# Altium footprint library LUMI_Handy_Soldering_LIB.PcbLib: 562 footprints (part 30 of 36)
Each footprint in its own frame and in the unit in brackets; x right, y up, seen from the top. Pads: shape width x height; smd on the part's side, far side on the other; paste and mask are expansions set on the pad; w line width, h text height; cw(c..) or ccw(c..) is an arc to the next point about the centre after c.
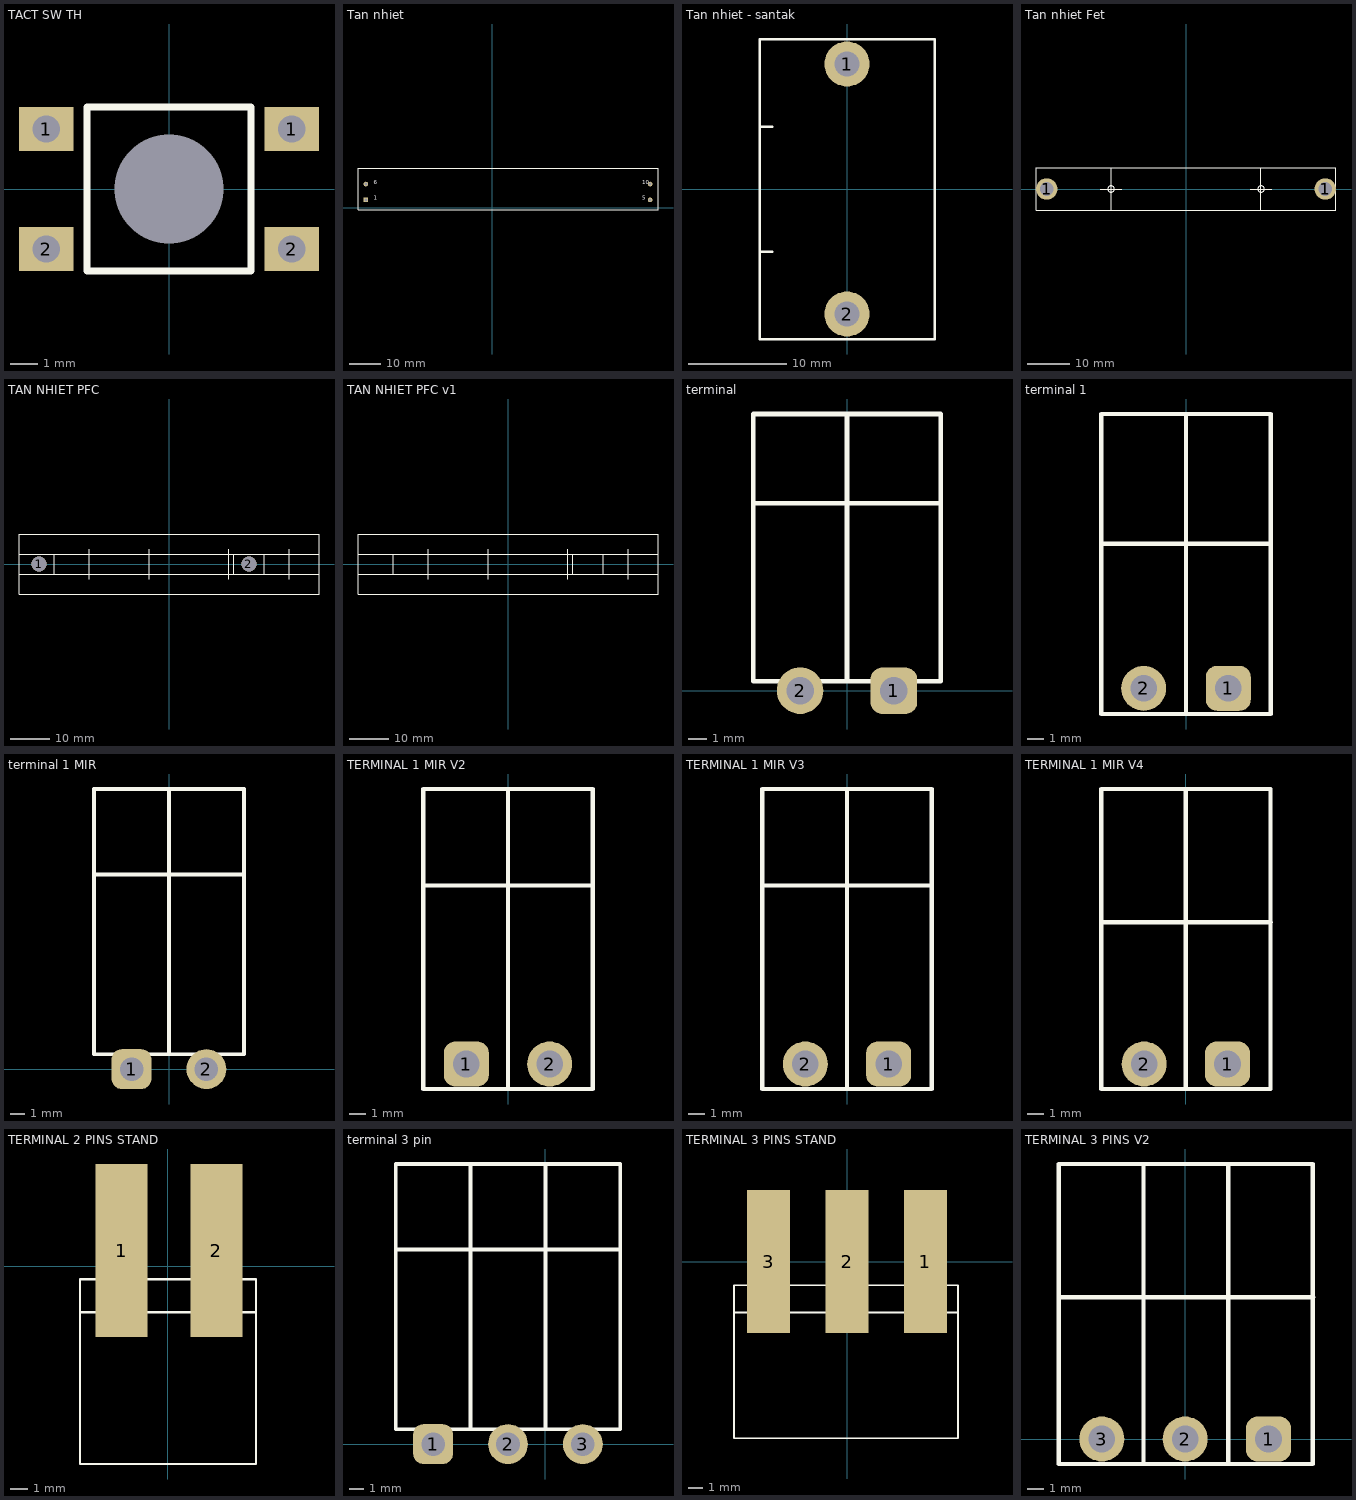
[diagram p29: the footprints below, top view; thin cyan lines are the x and y axes]

## TACT SW TH [mm]
pads (5):
  rect 2x1.6 hole 1: 1(-4.5,2.2) 1(4.5,2.2) 2(-4.5,-2.2) 2(4.5,-2.2)
  round 0 hole 4: ""(0,0)
Top Overlay:
  lines w0.254: -3,-3 3,-3 3,3 -3,3 -3,-3

## Tan nhiet [mm] "Connector; Header; 5x2 Position"
pads (4):
  rect 1.5x1.5 hole 0.9: 1(-40.64,2.54)
  round 1.5 hole 0.9: 5(50.8,2.54) 6(-40.64,7.62) 10(50.8,7.62)
Top Overlay:
  lines w0.2: -43.18,-0.635 53.34,-0.635 53.34,12.7 -43.18,12.7 -43.18,-0.635
  text "1" at -38.1,2.54 h1.27
  text "5" at 48.26,2.54 h1.27
  text "10" at 48.26,7.62 h1.27
  text "6" at -38.1,7.62 h1.27
3D body: height 103.52, standoff 0.52, extent -44.92,-0.979 55.08,33.02

## Tan nhiet - santak [mil]
pads (2):
  round 180 hole 100: 1(0,500) 2(0,-500)
Top Overlay:
  lines w10: -350,-250 -300,-250 ; -350,250 -300,250 ; -350,-600 350,-600 350,600 -350,600 -350,-600
Mechanical 1:
  circle w5: c0,500 r45
3D body: height 300, standoff -200, extent -50,-549.9 49.61,-450.1
3D body: height 300, standoff -200, extent -50,450.1 49.61,549.9
3D body: height 1400, standoff 10, extent -350,-600 350,602

## Tan nhiet Fet [mil]
pads (2):
  round 200 hole 130: 1(-1300,0) 1(1300,0)
Top Overlay:
  circle w10: c700,0 r30
  circle w10: c-700,0 r30
  lines w10: -800,0 -600,0 ; -700,-200 -700,200 ; 600,0 800,0 ; 700,-200 700,200 ; -1400,-200 -1400,200 1400,200 1400,-200 -1400,-200
3D body: height 300, standoff -200, extent 1200,-99.8 1399.21,99.8
3D body: height 899.8, standoff 700.2, extent 600.79,-200 800,200
3D body: height 899.8, standoff 700.2, extent -800,-200 -600.79,200
3D body: height 300, standoff -200, extent -1400,-99.8 -1200.79,99.8
3D body: height 899.8, standoff 700.2, extent -800,-200 -600.79,200
3D body: height 2300, standoff 5, extent -1400,-200 1400,200

## TAN NHIET PFC [mm]
pads (2):
  round 3.81 hole 3.81: 1(-33.02,0) 2(20.32,0)
Top Overlay:
  lines w0.127: -29.21,-2.54 -29.21,2.54 ; 16.51,-2.54 16.51,2.54 ; 24.13,-2.54 24.13,2.54
  lines w0.254: -38.1,-2.54 38.1,-2.54 ; -38.1,2.54 38.1,2.54 ; -20.32,-3.81 -20.32,3.81 ; -5.08,-3.81 -5.08,3.81 ; 15.24,-3.81 15.24,3.81 ; 30.48,-3.81 30.48,3.81 ; -38.1,-7.62 38.1,-7.62 38.1,7.62 -38.1,7.62 -38.1,-7.62
3D body: height 5.08, standoff 0, extent -38.1,-2.54 -29.21,2.54
3D body: height 5.08, standoff 0, extent 16.51,-2.54 24.13,2.54
3D body: height 33.02, standoff 5.08, extent -38.1,-2.54 38.1,2.54
3D body: height 38.1, standoff 33.02, extent -38.1,-7.62 -22.86,7.62
3D body: height 38.1, standoff 33.02, extent -17.78,-7.62 -2.54,7.62
3D body: height 38.1, standoff 33.02, extent 2.54,-7.62 17.78,7.62
3D body: height 38.1, standoff 33.02, extent 22.86,-7.62 38.1,7.62
3D body: height 53.34, standoff 38.1, extent -38.1,6.35 -22.86,7.62
3D body: height 53.34, standoff 38.1, extent -38.1,4.064 -22.86,5.334
3D body: height 53.34, standoff 38.1, extent -38.1,1.651 -22.86,2.921
3D body: height 53.34, standoff 38.1, extent -38.1,-0.635 -22.86,0.635
3D body: height 53.34, standoff 38.1, extent -38.1,-2.921 -22.86,-1.651
3D body: height 53.34, standoff 38.1, extent -38.1,-5.461 -22.86,-4.191
3D body: height 53.34, standoff 38.1, extent -38.1,-7.62 -22.86,-6.35
3D body: height 53.34, standoff 38.1, extent -17.78,6.35 -2.54,7.62
3D body: height 53.34, standoff 38.1, extent -17.78,4.064 -2.54,5.334
3D body: height 53.34, standoff 38.1, extent -17.78,1.651 -2.54,2.921
3D body: height 53.34, standoff 38.1, extent -17.78,-0.635 -2.54,0.635
3D body: height 53.34, standoff 38.1, extent -17.78,-2.921 -2.54,-1.651
3D body: height 53.34, standoff 38.1, extent -17.78,-5.461 -2.54,-4.191
3D body: height 53.34, standoff 38.1, extent -17.78,-7.62 -2.54,-6.35
3D body: height 53.34, standoff 38.1, extent 2.54,6.35 17.78,7.62
3D body: height 53.34, standoff 38.1, extent 2.54,4.064 17.78,5.334
3D body: height 53.34, standoff 38.1, extent 2.54,1.651 17.78,2.921
3D body: height 53.34, standoff 38.1, extent 2.54,-0.635 17.78,0.635
3D body: height 53.34, standoff 38.1, extent 2.54,-2.921 17.78,-1.651
3D body: height 53.34, standoff 38.1, extent 2.54,-5.461 17.78,-4.191
3D body: height 53.34, standoff 38.1, extent 2.54,-7.62 17.78,-6.35
3D body: height 53.34, standoff 38.1, extent 22.86,6.35 38.1,7.62
3D body: height 53.34, standoff 38.1, extent 22.86,4.064 38.1,5.334
3D body: height 53.34, standoff 38.1, extent 22.86,1.651 38.1,2.921
3D body: height 53.34, standoff 38.1, extent 22.86,-0.635 38.1,0.635
3D body: height 53.34, standoff 38.1, extent 22.86,-2.921 38.1,-1.651
3D body: height 53.34, standoff 38.1, extent 22.86,-5.461 38.1,-4.191
3D body: height 53.34, standoff 38.1, extent 22.86,-7.62 38.1,-6.35

## TAN NHIET PFC v1 [mm]
Top Overlay:
  lines w0.127: -29.21,-2.54 -29.21,2.54 ; 16.51,-2.54 16.51,2.54 ; 24.13,-2.54 24.13,2.54
  lines w0.254: -38.1,-2.54 38.1,-2.54 ; -38.1,2.54 38.1,2.54 ; -20.32,-3.81 -20.32,3.81 ; -5.08,-3.81 -5.08,3.81 ; 15.24,-3.81 15.24,3.81 ; 30.48,-3.81 30.48,3.81 ; -38.1,-7.62 38.1,-7.62 38.1,7.62 -38.1,7.62 -38.1,-7.62
3D body: height 5.08, standoff 0, extent -38.1,-2.54 -29.21,2.54
3D body: height 5.08, standoff 0, extent 16.51,-2.54 24.13,2.54
3D body: height 33.02, standoff 5.08, extent -38.1,-2.54 38.1,2.54
3D body: height 38.1, standoff 33.02, extent -38.1,-7.62 -22.86,7.62
3D body: height 38.1, standoff 33.02, extent -17.78,-7.62 -2.54,7.62
3D body: height 38.1, standoff 33.02, extent 2.54,-7.62 17.78,7.62
3D body: height 38.1, standoff 33.02, extent 22.86,-7.62 38.1,7.62
3D body: height 53.34, standoff 38.1, extent -38.1,6.35 -22.86,7.62
3D body: height 53.34, standoff 38.1, extent -38.1,4.064 -22.86,5.334
3D body: height 53.34, standoff 38.1, extent -38.1,1.651 -22.86,2.921
3D body: height 53.34, standoff 38.1, extent -38.1,-0.635 -22.86,0.635
3D body: height 53.34, standoff 38.1, extent -38.1,-2.921 -22.86,-1.651
3D body: height 53.34, standoff 38.1, extent -38.1,-5.461 -22.86,-4.191
3D body: height 53.34, standoff 38.1, extent -38.1,-7.62 -22.86,-6.35
3D body: height 53.34, standoff 38.1, extent -17.78,6.35 -2.54,7.62
3D body: height 53.34, standoff 38.1, extent -17.78,4.064 -2.54,5.334
3D body: height 53.34, standoff 38.1, extent -17.78,1.651 -2.54,2.921
3D body: height 53.34, standoff 38.1, extent -17.78,-0.635 -2.54,0.635
3D body: height 53.34, standoff 38.1, extent -17.78,-2.921 -2.54,-1.651
3D body: height 53.34, standoff 38.1, extent -17.78,-5.461 -2.54,-4.191
3D body: height 53.34, standoff 38.1, extent -17.78,-7.62 -2.54,-6.35
3D body: height 53.34, standoff 38.1, extent 2.54,6.35 17.78,7.62
3D body: height 53.34, standoff 38.1, extent 2.54,4.064 17.78,5.334
3D body: height 53.34, standoff 38.1, extent 2.54,1.651 17.78,2.921
3D body: height 53.34, standoff 38.1, extent 2.54,-0.635 17.78,0.635
3D body: height 53.34, standoff 38.1, extent 2.54,-2.921 17.78,-1.651
3D body: height 53.34, standoff 38.1, extent 2.54,-5.461 17.78,-4.191
3D body: height 53.34, standoff 38.1, extent 2.54,-7.62 17.78,-6.35
3D body: height 53.34, standoff 38.1, extent 22.86,6.35 38.1,7.62
3D body: height 53.34, standoff 38.1, extent 22.86,4.064 38.1,5.334
3D body: height 53.34, standoff 38.1, extent 22.86,1.651 38.1,2.921
3D body: height 53.34, standoff 38.1, extent 22.86,-0.635 38.1,0.635
3D body: height 53.34, standoff 38.1, extent 22.86,-2.921 38.1,-1.651
3D body: height 53.34, standoff 38.1, extent 22.86,-5.461 38.1,-4.191
3D body: height 53.34, standoff 38.1, extent 22.86,-7.62 38.1,-6.35

## terminal [mm]
pads (2):
  rrect50% 2.524x2.524 hole 1.5: 1(2.54,0)
  round 2.524 hole 1.5: 2(-2.54,0)
Top Overlay:
  lines w0.254: -5.08,10.16 5.08,10.16 ; 0,0.508 0,14.986 ; -5.08,0.508 -5.08,13.97 -5.08,14.986 5.08,14.986 5.08,0.508 -5.08,0.508
3D body: height 3, standoff -9.5, extent -5.55,-0.388 5,14.008

## terminal 1 [mm]
pads (2):
  rrect50% 2.7x2.7 hole 1.6: 1(2.54,2.54)
  round 2.7 hole 1.6: 2(-2.54,2.54)
Top Overlay:
  lines w0.254: -5.08,11.208 5.08,11.208 ; 0,1 0,19 ; -5.08,1 -5.08,13.97 -5.08,19 5.08,19 5.08,1 -5.08,1
3D body: height 3.5, standoff -11, extent -5.602,-0.489 5.631,19.512

## terminal 1 MIR [mm]
pads (2):
  rrect50% 2.7x2.7 hole 1.6: 1(-2.54,0)
  round 2.7 hole 1.6: 2(2.54,0)
Top Overlay:
  lines w0.254: -5.08,13.208 5.08,13.208 ; 0,1 0,19 ; -5.08,1 -5.08,13.97 -5.08,19 5.08,19 5.08,1 -5.08,1
3D body: height 3.5, standoff -11, extent -5.602,-0.489 5.631,19.512

## TERMINAL 1 MIR V2 [mm]
pads (2):
  rrect50% 2.7x2.7 hole 1.6: 1(-2.5,2.5)
  round 2.7 hole 1.6: 2(2.5,2.5)
Top Overlay:
  lines w0.254: -5.08,13.208 5.08,13.208 ; 0,1 0,19 ; -5.08,1 5.08,1 5.08,19 -5.08,19 -5.08,13.97 -5.08,1
3D body: height 3.5, standoff -11, extent -5.602,-0.489 5.631,19.512

## TERMINAL 1 MIR V3 [mm]
pads (2):
  rrect50% 2.7x2.7 hole 1.6: 1(2.5,2.5)
  round 2.7 hole 1.6: 2(-2.5,2.5)
Top Overlay:
  lines w0.254: -5.08,13.208 5.08,13.208 ; 0,1 0,19 ; -5.08,1 -5.08,13.97 -5.08,19 5.08,19 5.08,1 -5.08,1
3D body: height 3.5, standoff -11, extent -5.602,-0.489 5.631,19.512

## TERMINAL 1 MIR V4 [mm]
pads (2):
  rrect50% 2.7x2.7 hole 1.6: 1(2.5,2.5)
  round 2.7 hole 1.6: 2(-2.5,2.5)
Top Overlay:
  lines w0.254: -5.06,11 5.1,11 ; 0,1 0,19 ; -5.08,1 -5.08,13.97 -5.08,19 5.08,19 5.08,1 -5.08,1
3D body: height 3.5, standoff -11, extent -5.602,-0.489 5.631,19.512

## TERMINAL 2 PINS STAND [mm]
pads (2):
  rect 3x10 smd: 1(-2.667,0.889) 2(2.794,0.889)
Top Overlay:
  lines w0.127: -5.08,-2.667 5.08,-2.667 ; -5.08,-11.43 5.08,-11.43 5.08,-0.762 -5.08,-0.762 -5.08,-11.43
3D body: height -0.4, standoff -20.4, extent -5.617,-11.303 5.616,3.201

## terminal 3 pin [mm]
pads (3):
  rrect50% 2.7x2.7 hole 1.6: 1(-7.62,0)
  round 2.7 hole 1.6: 2(-2.54,0) 3(2.54,0)
Top Overlay:
  lines w0.254: -10.16,1 -10.16,19 -5.08,19 ; -10.16,13.208 -5.08,13.208 5.08,13.208 ; -10.08,1 -5,1 ; 0,1 0,19 ; -5.08,19 -5.08,13.97 -5.08,1 5.08,1 5.08,19 -5.08,19
3D body: height 3.5, standoff -11, extent -10.682,-0.489 0.551,19.512
3D body: height 3.5, standoff -11, extent -5.602,-0.489 5.631,19.512

## TERMINAL 3 PINS STAND [mm]
pads (3):
  rect 3x10 smd: 1(5.461,0) 2(0,0) 3(-5.461,0)
Top Overlay:
  lines w0.127: -7.874,-3.556 7.747,-3.556 ; -7.874,-12.319 7.747,-12.319 7.747,-1.651 -7.874,-1.651 -7.874,-12.319
3D body: height -0.3, standoff -20.3, extent -3.077,-12.244 8.156,2.259
3D body: height -0.3, standoff -20.3, extent -8.41,-12.244 2.823,2.259

## TERMINAL 3 PINS V2 [mm]
pads (3):
  rrect50% 2.7x2.7 hole 1.6: 1(5,0)
  round 2.7 hole 1.6: 2(0,0) 3(-5,0)
Top Overlay:
  lines w0.254: -7.56,8.5 2.6,8.5 7.68,8.5 ; -2.5,-1.5 -2.5,16.5 ; 2.58,-1.5 7.66,-1.5 7.66,16.5 2.58,16.5 ; 2.58,-1.5 -7.58,-1.5 -7.58,11.47 -7.58,16.5 2.58,16.5 ; 2.58,-1.5 2.58,16.5
3D body: height 3.5, standoff -11, extent -3.002,-2.989 8.231,17.012
3D body: height 3.5, standoff -11, extent -8.102,-2.989 3.131,17.012